# Altium footprint library klp.PcbLib: 436 footprints (part 21 of 28)
Each footprint in its own frame and in the unit in brackets; x right, y up, seen from the top. Pads: shape width x height; smd on the part's side, far side on the other; paste and mask are expansions set on the pad; w line width, h text height; cw(c..) or ccw(c..) is an arc to the next point about the centre after c.
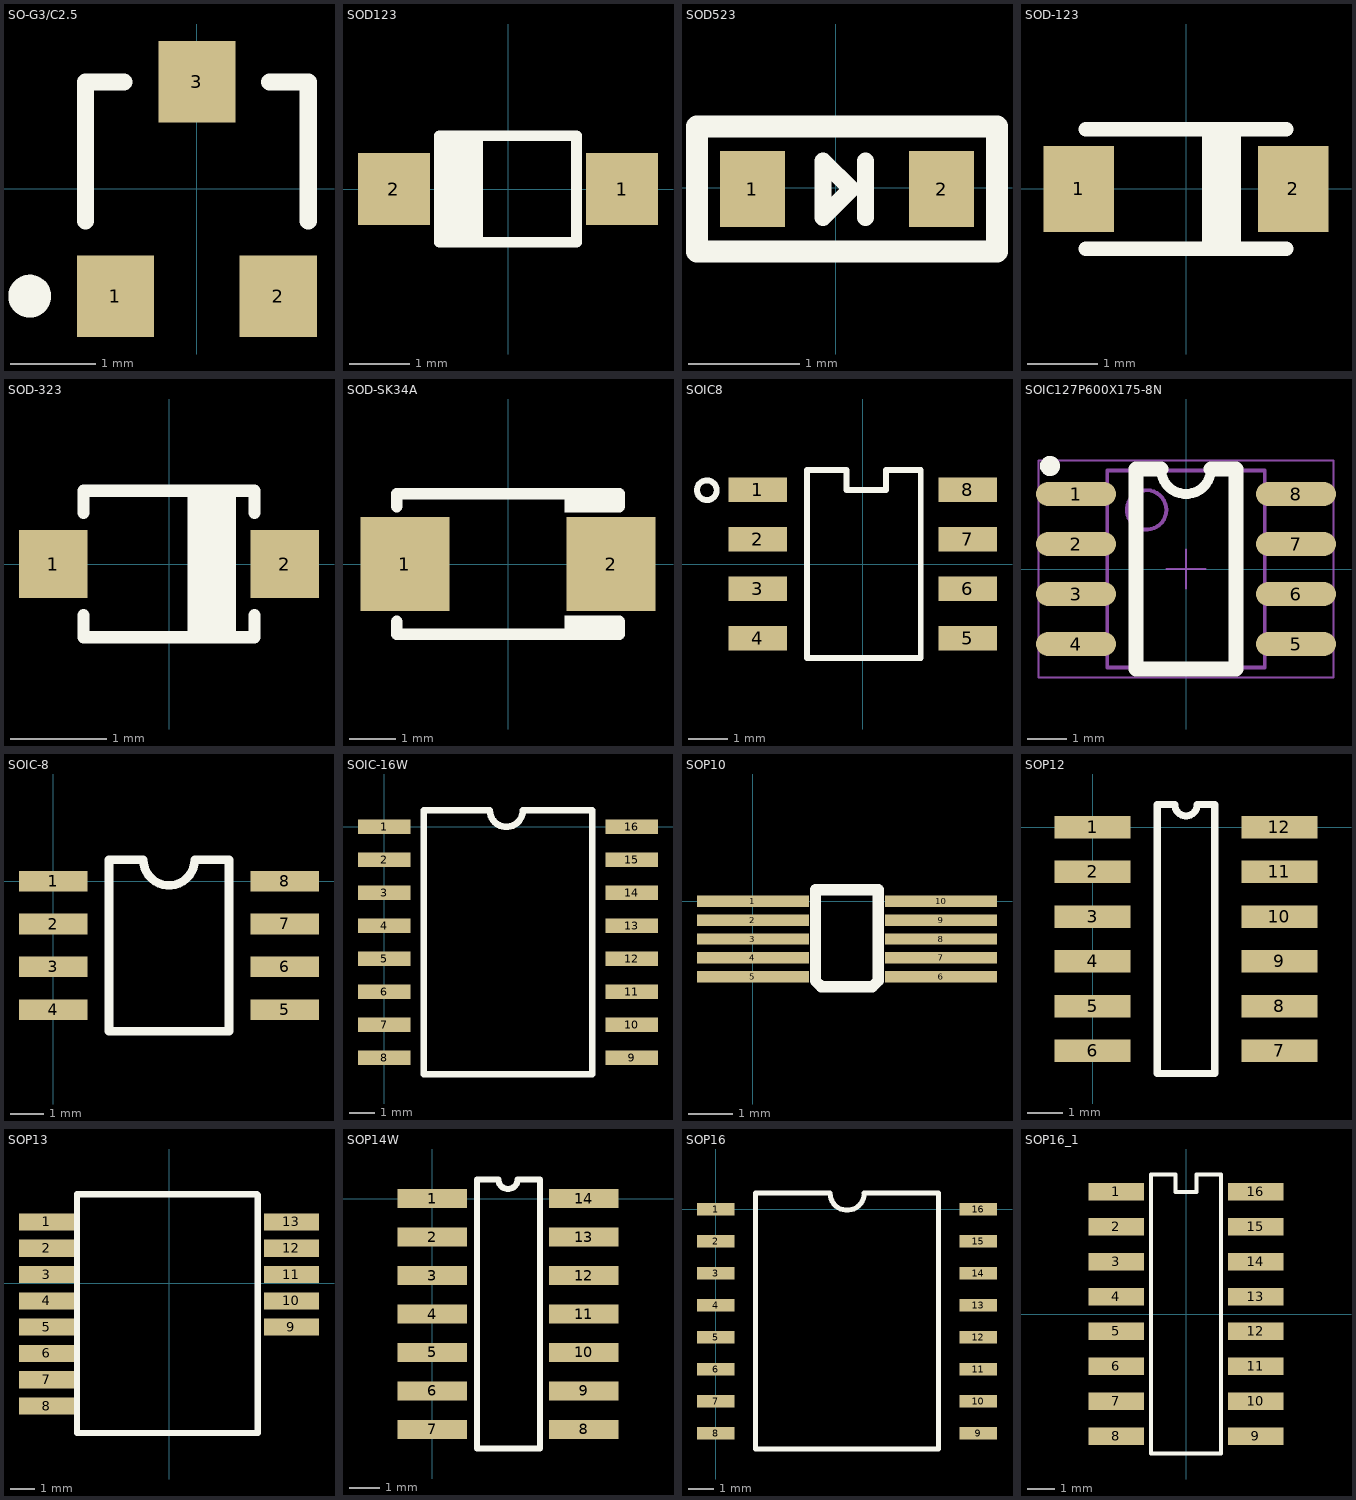
[diagram p20: the footprints below, top view; thin cyan lines are the x and y axes]

## SO-G3/C2.5 [mm] "SOT-23; 3 Leads; Body 3.0 x 2.6 mm, inc. leads (LxW max)"
height 1.1
pads (3):
  rect 0.9x0.95 smd: 1(-0.95,-1.25) 2(0.95,-1.25) 3(0,1.25)
Top Overlay:
  circle w0.25: c-1.95,-1.25 r0.125
  lines w0.2: -1.3,-0.375 -1.3,1.25 -0.85,1.25 ; 0.85,1.25 1.3,1.25 1.3,-0.375

## SOD123 [mm]
pads (2):
  rect 1.2x1.2 smd: 1(1.905,0) 2(-1.905,0)
Top Overlay:
  rectangle: -1.143,-0.889 -0.508,0.889
  lines w0.178: -0.508,-0.889 -0.508,0.889 ; -1.143,-0.889 1.143,-0.889 1.143,-0.445 1.143,0.445 1.143,0.889 -1.143,0.889 -1.143,-0.889
3D body "User Library-SOD3716X14.step": height 1.35, standoff 0, extent -1.825,-0.775 1.875,0.775

## SOD523 [mil]
pads (2):
  rect 23x27 smd: 1(-29.57,-0.51) 2(37.43,-0.51)
Top Overlay:
  lines w6: 10.43,-10.51 10.43,9.49 ; -4.57,-10.51 5.43,-0.51 -4.57,9.49 -4.57,-10.51
  lines w7.87: -49.21,-22.64 56.1,-22.64 57.09,-22.64 57.09,21.65 -48.23,21.65 -49.21,21.65 -49.21,-21.65 -49.21,-22.64
3D body "User Library-SOD-523F.step": height 27.56, standoff 0, extent -28.55,-16.69 34.45,14.71

## SOD-123 [mm]
pads (2):
  rect 1x1.22 smd: 1(-1.524,0) 2(1.524,0)
Top Overlay:
  lines w0.203: -1.425,-0.85 1.425,-0.85 ; -1.425,0.85 1.425,0.85 ; 0.327,-0.85 0.327,0.85 ; 0.505,-0.85 0.505,0.85 ; 0.683,-0.85 0.683,0.85
3D body "SOD-123.STEP": height 1.2, standoff 0, extent -1.854,-0.813 1.846,0.787

## SOD-323 [mil]
pads (2):
  rect 28x28 smd: 1(-47.5,0) 2(47.5,0)
Top Overlay:
  lines w5: -35,-21 -35,-30 35,-30 35,-21 ; -35,21 -35,30 35,30 35,21 ; 10,-30 10,30 ; 15,-30 15,30 ; 20,-30 20,30 ; 25,-30 25,30
3D body "SOD-323.STEP": height 39.37, standoff 0, extent -51,-26 51.36,25.18

## SOD-SK34A [mil]
pads (2):
  rect 76x80 smd: 1(-88,0) 2(88,0)
Top Overlay:
  rectangle: 48,-60 95,-44
  rectangle: 48,44 95,60
  lines w10: -95,-49 -95,-60 95,-60 95,-49 ; -95,49 -95,60 95,60 95,49
3D body "DO-214AC.STEP": height 94.49, standoff 0, extent -91.52,-53.55 89.58,52.75

## SOIC8 [mm]
pads (8):
  rect 1.5x0.635 smd: 1(-2.7,1.905) 2(-2.7,0.635) 3(-2.7,-0.635) 4(-2.7,-1.905) 5(2.7,-1.905) 6(2.7,-0.635) 7(2.7,0.635) 8(2.7,1.905)
Top Overlay:
  circle w0.152: c-4.004,1.896 r0.254
  lines w0.152: -1.43,-2.413 -1.43,2.413 -0.414,2.413 -0.414,1.905 0.602,1.905 0.602,2.413 1.491,2.413 1.491,-2.413 -1.43,-2.413
3D body "User Library-SOIC-8-1.step": height 1.75, standoff 0, extent -3.012,-2.432 2.988,2.468

## SOIC127P600X175-8N [mil]
pads (8):
  oval 80x24 smd: 1(-110,75) 2(-110,25) 3(-110,-25) 4(-110,-75) 5(110,-75) 6(110,-25) 7(110,25) 8(110,75)
Top Overlay:
  circle w10: c-136,103 r5
  lines w10: -25,100 ccw(c0,100) 25,100
  lines w15: -25,100 -50,100 -50,-100 50,-100 50,100 25,100
Mechanical 15:
  circle w3.94: c-39.37,59.06 r19.68
  lines w3.94: -78.74,-98.43 -78.74,98.43 78.74,98.43 78.74,-98.43 -78.74,-98.43
  text "1" at 17.71,-6.47 h29.53
Mechanical 16:
  lines w0.04: -78.74,-98.43 -78.74,98.43 78.74,98.43 78.74,-98.43 -78.74,-98.43
  lines w1.97: -19.68,0 19.68,0 ; 0,-19.68 0,19.68 ; -147.64,-108.27 -147.64,108.27 147.64,108.27 147.64,-108.27 -147.64,-108.27
3D body "SW3DPS-SO-8 (PIC12FXXX)-DEFAULT.STEP": height 61.02, standoff -1.97, extent -117.91,-96 117.91,96.91

## SOIC-8 [mil] "SOIC"
height 59.06
pads (8):
  rect 80x24 smd: 1(0,0) 2(0,-50.06) 3(0,-100.06) 4(0,-150.06) 5(270,-150) 6(270,-100) 7(270,-50) 8(270,0)
Top Overlay:
  lines w10: 75,24.94 75.06,25 105,25 ccw(c135,25) 165,25 204.94,25 205,24.94 205,-175.06 65,-175.06 65,24.94 95,24.94

## SOIC-16W [mil] "SIZE:10mm*10.8mm;PIN:1.27mm;"
height 94.49
pads (16):
  rect 80x22 smd: 1(0,0) 2(0,-50) 3(0,-100) 4(0,-150) 5(0,-200) 6(0,-250) 7(0,-300) 8(0,-350) 9(375,-350) 10(375,-300) 11(375,-250) 12(375,-200) 13(375,-150) 14(375,-100) 15(375,-50) 16(375,0)
Top Overlay:
  lines w10: 60,-375 315,-375 315,25 210,25 cw(c185,25) 160,25 60,25 60,-375

## SOP10 [mm]
pads (10):
  rect 2.5x0.254 smd: 1(0,0) 2(0,-0.421) 3(0,-0.842) 4(0,-1.263) 5(0,-1.684) 6(4.2,-1.684) 7(4.2,-1.263) 8(4.2,-0.842) 9(4.2,-0.421) 10(4.2,0)
Top Overlay:
  lines w0.254: 1.397,-1.778 1.524,-1.905 2.667,-1.905 2.794,-1.778 2.794,0.254 1.397,0.254 1.397,-1.778

## SOP12 [mil]
pads (12):
  rect 85x25 smd: 1(0,0) 2(0,-50) 3(0,-100) 4(0,-150) 5(0,-200) 6(0,-250) 7(208.66,-250) 8(208.66,-200) 9(208.66,-150) 10(208.66,-100) 11(208.66,-50) 12(208.66,0)
Top Overlay:
  lines w7.87: 72.24,-275 136.42,-275 136.42,25 116.83,25 cw(c104.33,25) 91.83,25 72.24,25 72.24,-275

## SOP13 [mil] "TEA5767"
height 39.37
pads (13):
  rect 90x28 smd: 1(-200,100) 2(-200,57) 3(-200,14) 4(-200,-29) 5(-200,-72) 6(-200,-115) 7(-200,-158) 8(-200,-201) 9(200,-72) 10(200,-29) 11(200,14) 12(200,57) 13(200,100)
Top Overlay:
  lines w10: 144,145 -150,145 -150,-245 145,-245 145,144

## SOP14W [mil] "CD4066"
height 39.37
pads (14):
  rect 90x25 smd: 1(0,0) 2(0,-50) 3(0,-100) 4(0,-150) 5(0,-200) 6(0,-250) 7(0,-300) 8(196.85,-300) 9(196.85,-250) 10(196.85,-200) 11(196.85,-150) 12(196.85,-100) 13(196.85,-50) 14(196.85,0)
Top Overlay:
  lines w7.87: 57.87,-325 57.87,25 85.93,25 ccw(c98.43,25) 110.93,25 140,25 140,-325 57.87,-325

## SOP16 [mm] "1.28mm"
height 2
pads (16):
  rect 1.5x0.5 smd: 1(0,0) 2(0,-1.28) 3(0,-2.56) 4(0,-3.84) 5(0,-5.12) 6(0,-6.4) 7(0,-7.68) 8(0,-8.96) 9(10.5,-8.96) 10(10.5,-7.68) 11(10.5,-6.4) 12(10.5,-5.12) 13(10.5,-3.84) 14(10.5,-2.56) 15(10.5,-1.28) 16(10.5,0)
Top Overlay:
  lines w0.2: 1.585,-9.6 8.915,-9.6 8.915,0.64 5.94,0.64 cw(c5.256,0.64) 4.572,0.64 1.585,0.64 1.585,-9.6

## SOP16_1 [mil]
pads (16):
  rect 80x25 smd: 1(-100,175) 2(-100,125) 3(-100,75) 4(-100,25) 5(-100,-25) 6(-100,-75) 7(-100,-125) 8(-100,-175) 9(100,-175) 10(100,-125) 11(100,-75) 12(100,-25) 13(100,25) 14(100,75) 15(100,125) 16(100,175)
Top Overlay:
  lines w6: -50,-200 -50,200 -15,200 -15,175 15,175 15,200 50,200 50,-200 -50,-200
3D body "User Library-TLP291-4(SOP16).STEP": height 82.68, standoff 0, extent -139.18,-201.76 136.41,203.75